# Altium footprint library ADP_Connector.PcbLib: 36 footprints (part 3 of 3)
Each footprint in its own frame and in the unit in brackets; x right, y up, seen from the top. Pads: shape width x height; smd on the part's side, far side on the other; paste and mask are expansions set on the pad; w line width, h text height; cw(c..) or ccw(c..) is an arc to the next point about the centre after c.
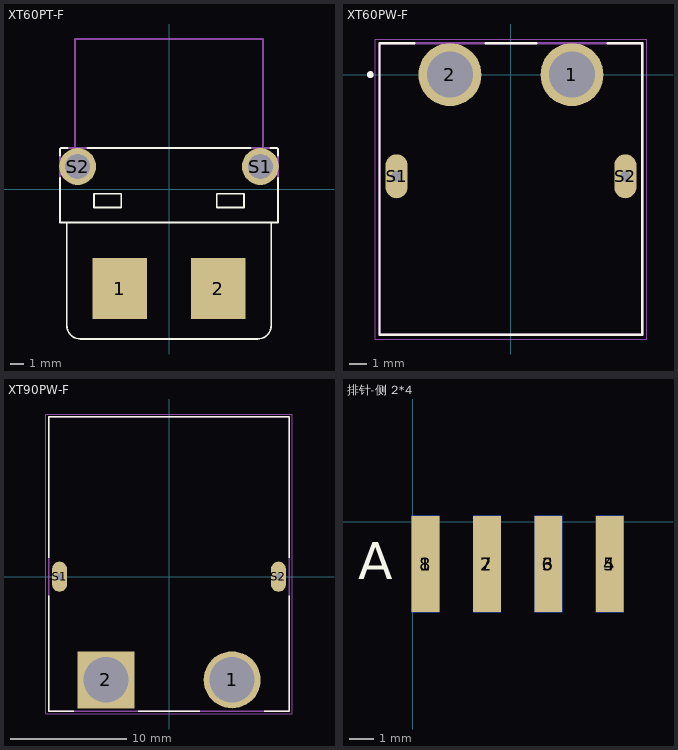
[diagram p2: the footprints below, top view; thin cyan lines are the x and y axes]

## XT60PT-F [mm]
pads (4):
  rect 4x4.5 smd: 1(-3.6,-7.3) 2(3.6,-7.3)
  round 2.7 hole 1.8 slot 1.8 at 0 deg: S1(6.7,1.65) S2(-6.7,1.65)
Top Overlay:
  lines w0.127: -8,0.8 -8,-2.45 -7.5,-2.45 ; -8,2.45 -8,2.9 cw(c-7.9,2.9) -7.9,3 -7.45,3 ; -7.5,-10 ccw(c-6.5,-10) -6.5,-11 6.5,-11 ccw(c6.5,-10) 7.5,-10 ; -7.5,-10 -7.5,-2.45 ; -6,3 6,3 ; 7.45,3 7.9,3 cw(c7.9,2.9) 8,2.9 8,2.45 ; 7.5,-10 7.5,-2.45 ; 8,0.8 8,-2.45 7.5,-2.45 ; -7.5,-2.45 7.5,-2.45 ; -5.5,-1.35 -3.5,-1.35 -3.5,-0.35 -5.5,-0.35 -5.5,-1.35 ; 3.5,-1.35 5.5,-1.35 5.5,-0.35 3.5,-0.35 3.5,-1.35
Mechanical 15:
  lines w0.127: -8,0.8 -8,2.45 ; -7.45,3 -6,3 ; -6.9,3 -6.9,11 6.9,11 6.9,3 ; 6,3 7.45,3 ; 8,0.8 8,2.45

## XT60PW-F [mm]
height 8.4
pads (4):
  round 3.716 hole 2.7: 1(3.6,0) 2(-3.6,0)
  oval 1.3x2.6 hole 0.6 square: S1(-6.75,-6) S2(6.75,-6)
Top Overlay:
  circle w0.2: c-8.3,0 r0.1
  lines w0.127: -5.71,1.85 -7.75,1.85 -7.75,-15.35 7.75,-15.35 7.75,1.85 5.71,1.85 ; -1.49,1.85 1.49,1.85
Mechanical 13:
  circle w0.2: c-8.3,0 r0.1
  lines w0.127: -7.75,-15.35 -7.75,1.85 7.75,1.85 7.75,-15.35 -7.75,-15.35
Mechanical 15:
  lines w0.05: -8,-15.6 -8,2.1 8,2.1 8,-15.6 -8,-15.6
3D body "step_temp.STEP": height 8.4, standoff -2.55, extent -7.75,-15.35 7.75,1.85

## XT90PW-F [mm]
pads (4):
  round 4.916 hole 3.9: 1(5.45,-8.9)
  rect 4.916x4.916 hole 3.9: 2(-5.45,-8.9)
  oval 1.3x2.6 hole 0.6 square: S1(-9.45,0) S2(9.45,0)
Top Overlay:
  lines w0.127: -10.4,-1.62 -10.4,-11.6 -8.228,-11.6 ; -10.4,1.62 -10.4,13.8 10.4,13.8 10.4,1.62 ; -2.672,-11.6 2.672,-11.6 ; 8.228,-11.6 10.4,-11.6 10.4,-1.62
Mechanical 13:
  lines w0.127: -10.4,-11.6 -10.4,13.8 10.4,13.8 10.4,-11.6 -10.4,-11.6
Mechanical 15:
  lines w0.05: -10.65,-11.85 10.65,-11.85 10.65,14.05 -10.65,14.05 -10.65,-11.85
3D body "step_temp.STEP": height 10.3, standoff -3.2, extent -10.75,-11.6 10.75,13.8

## 排针-侧 2*4 [mil]
pads (8):
  rect 45x157 smd: 1(21.06,-68.84) 2(121.06,-68.84) 3(221.06,-68.84) 4(321.06,-68.84)
  rect 45x157 smd far side: 5(321.06,-68.84) 6(221.06,-68.84) 7(121.06,-68.84) 8(21.06,-68.84)
Top Overlay:
  text "A" at -88.94,-93.84 h60
Bottom Overlay:
  text "B" at 396.06,-88.84 h60